# Altium footprint library DriverBoardForCNC.PcbLib: 26 footprints (part 1 of 2)
Each footprint in its own frame and in the unit in brackets; x right, y up, seen from the top. Pads: shape width x height; smd on the part's side, far side on the other; paste and mask are expansions set on the pad; w line width, h text height; cw(c..) or ccw(c..) is an arc to the next point about the centre after c.
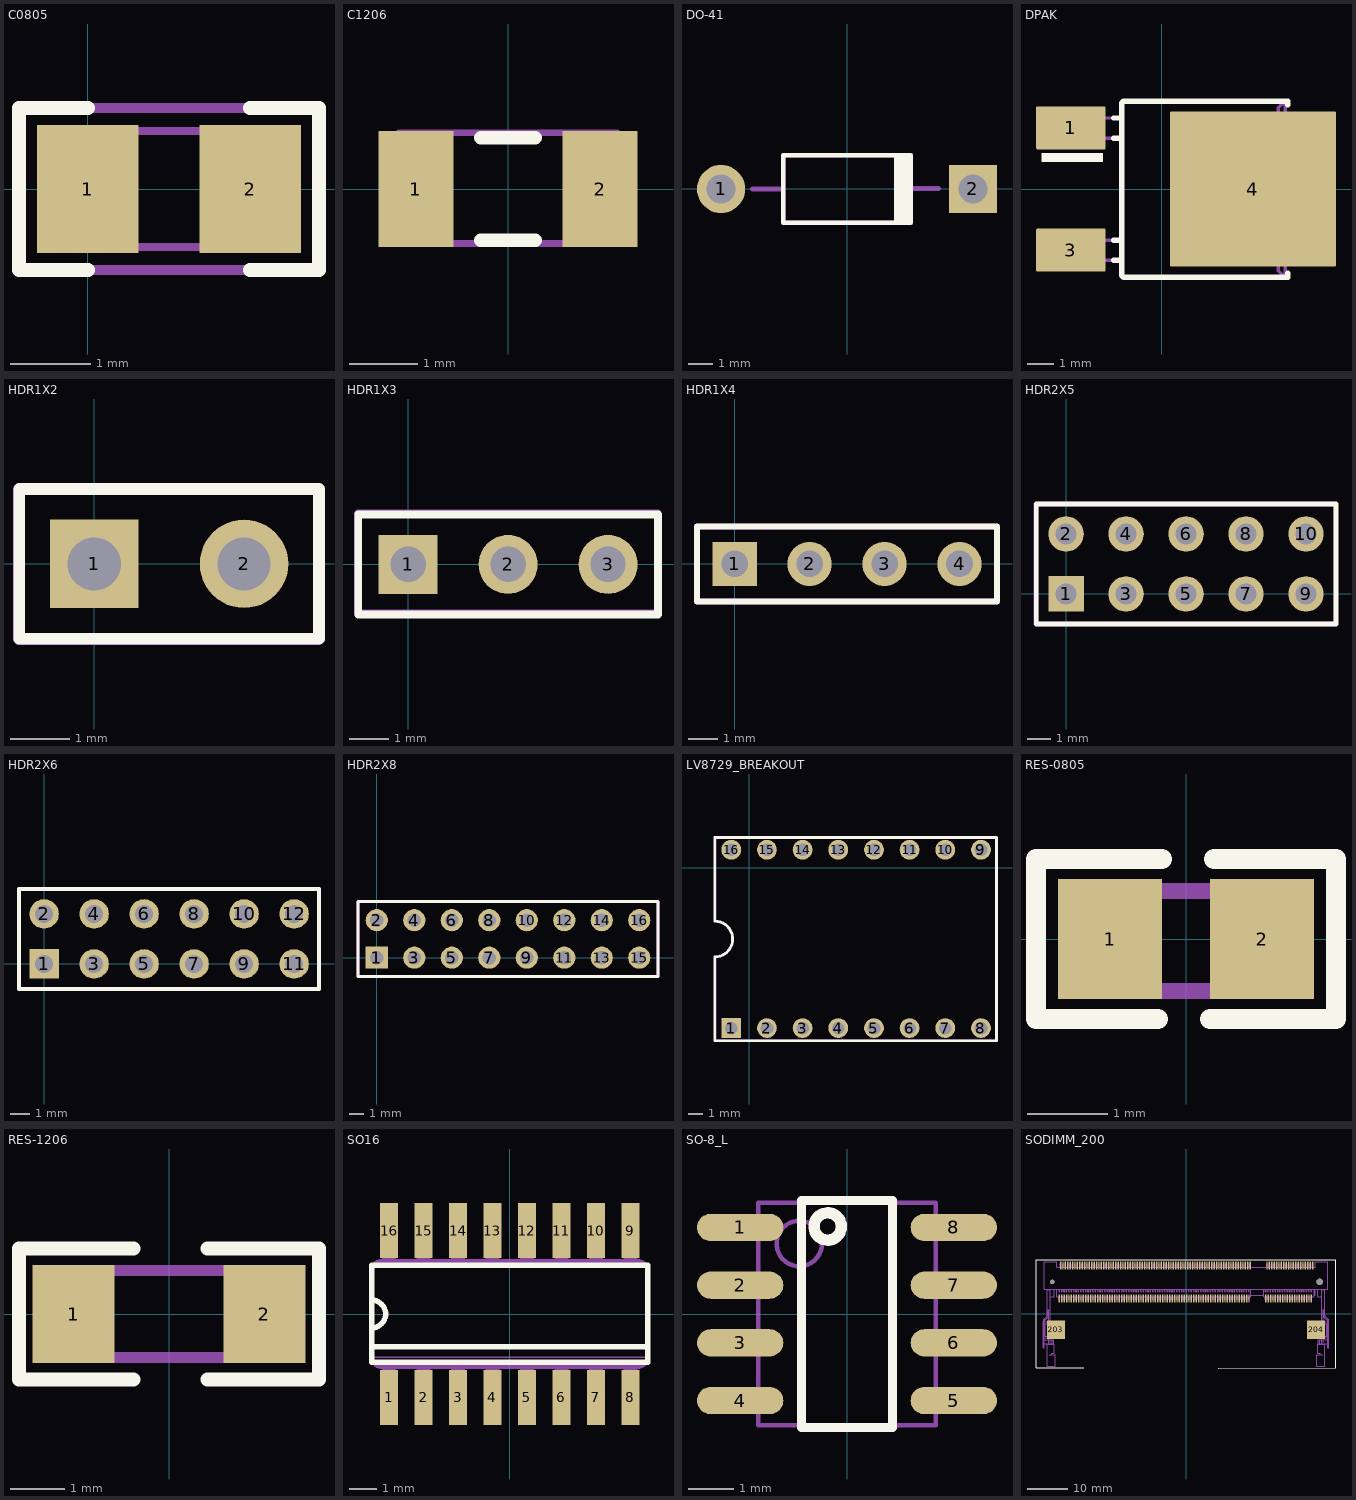
[diagram p0: the footprints below, top view; thin cyan lines are the x and y axes]

## C0805 [mil]
pads (2):
  rect 50x63 smd: 1(0,0) 2(80,0)
Top Overlay:
  lines w7: 0,-40 -34,-40 -34,0 -34,40 0,40 ; 80,-40 114,-40 114,0 114,40 80,40
M5-Top Constraints:
  lines w5: -34,-40 -34,40 114,40 114,-40 -34,-40
  text ".Designator" at -24,-17 h35
M13-Bottom 3D Body:
  lines w3.94: 14.41,-28.54 14.41,28.54 ; 65.59,-28.54 65.59,28.54 ; -3.31,-28.54 -3.31,28.54 83.31,28.54 83.31,-28.54 -3.31,-28.54
3D body "CAP 0805.x_t": height 50.66, standoff 0.5, extent -0.35,-24.57 78.39,25.59

## C1206 [mm] "Chip Capacitor, Body 3.2x1.6mm, IPC High Density"
height 1.3
pads (2):
  rect 1.1x1.7 smd: 1(-1.35,0) 2(1.35,0)
Top Overlay:
  lines w0.2: -0.4,-0.75 0.4,-0.75 ; -0.4,0.75 0.4,0.75
M14-Top Assembly:
  lines w0.1: -1.6,-0.8 1.6,-0.8 1.6,0.825 -1.6,0.825 -1.6,-0.8
3D body "CAP 1206.x_t": height 1.64, standoff 0.01, extent -1.6,-0.8 1.6,0.824

## DO-41 [mm] "Diode, Axial; Body 5.2 x 2.7 mm (LxDia. max), Lead Dia. 0.86 mm (max)"
height 2.8
pads (2):
  round 2 hole 1.2: 1(-5.23,0)
  rect 2x2 hole 1.2: 2(5.23,0)
Top Overlay:
  rectangle: 1.95,-1.4 2.75,1.4
  lines w0.2: 2.65,-1.4 -2.65,-1.4 -2.65,1.4 2.65,1.4
M14-Top Assembly:
  rectangle: 1.95,-1.4 2.75,1.4
  lines w0.2: -3.925,0 -2.65,0 ; 2.65,-1.4 -2.65,-1.4 -2.65,1.4 2.65,1.4 ; 2.675,0.025 3.8,0.025
3D body "DO-41-L=10.5.x_t": height 2.82, standoff -2.3, extent -5.654,-1.319 5.704,1.32

## DPAK [mm] "D-PAK, 3-Pads, Body 6.22x6.73mm (max), TO-252AA using nominal STEP model"
height 2.39
pads (3):
  rrect6% 2.6x1.6 smd: 1(-3.4,2.28) 3(-3.4,-2.28)
  rrect2% 6.2x5.8 smd paste-2.9: 4(3.4,0)
Top Overlay:
  rectangle: -4.5,1 -2.2,1.35
  lines w0.2: -1.8,1.9 -1.5,1.9 ; -1.8,2.65 -1.5,2.65 ; 4.7,-3.3 -1.429,-3.3 -1.5,-3.229 -1.5,-3.157 -1.5,-2.665 ; 4.7,-3.28 4.7,-3.15 ; 4.7,3.15 4.7,3.28 -1.429,3.28 -1.5,3.209 -1.5,3.137 -1.5,-1.915 ; -1.8,-2.665 -1.5,-2.665 ; -1.8,-2.665 -1.5,-2.665 ; -1.8,-2.665 -1.5,-2.665 ; -1.8,-1.915 -1.5,-1.915 ; -1.8,-1.915 -1.5,-1.915 ; -1.8,-1.915 -1.5,-1.915 ; -1.5,-2.665 -1.5,-1.915 ; -1.5,-2.665 -1.5,-1.915 ; -1.5,-2.665 -1.5,-1.915
Top Paste:
  rectangle: 0.4,1.625 1.675,2.8
  rectangle: 1.975,1.625 3.25,2.8
  rectangle: 3.55,1.625 4.825,2.8
  rectangle: 5.125,1.625 6.4,2.8
  rectangle: 0.4,0.15 1.675,1.325
  rectangle: 1.975,0.15 3.25,1.325
  rectangle: 3.55,0.15 4.825,1.325
  rectangle: 5.125,0.15 6.4,1.325
  rectangle: 0.4,-1.325 1.675,-0.15
  rectangle: 1.975,-1.325 3.25,-0.15
  rectangle: 3.55,-1.325 4.825,-0.15
  rectangle: 5.125,-1.325 6.4,-0.15
  rectangle: 5.125,-2.8 6.4,-1.625
  rectangle: 3.55,-2.8 4.825,-1.625
  rectangle: 1.975,-2.8 3.25,-1.625
  rectangle: 0.4,-2.8 1.675,-1.625
M5-Top Constraints:
  lines w0.127: -1.5,1.9 -2.757,1.9 -3.157,1.9 ; -1.5,2.65 -2.757,2.65 -3.157,2.65 ; -3.899,-2.665 -3.357,-2.665 ; -3.899,-2.665 -3.899,-1.915 ; -3.899,-2.665 -3.357,-2.665 ; -3.899,-2.665 -3.899,-1.915 ; -3.899,-2.665 -3.357,-2.665 ; -3.899,-2.665 -3.899,-1.915 ; -3.899,-1.915 -3.357,-1.915 ; -3.899,-1.915 -3.357,-1.915 ; -3.899,-1.915 -3.357,-1.915 ; -3.357,-2.665 -3.157,-2.665 ; -3.357,-2.665 -3.157,-2.665 ; -3.357,-2.665 -3.157,-2.665 ; -3.357,-1.915 -3.157,-1.915 ; -3.357,-1.915 -3.157,-1.915 ; -3.357,-1.915 -3.157,-1.915 ; -3.157,-2.665 -3.157,-1.915 ; -3.157,-2.665 -2.757,-2.665 ; -3.157,-2.665 -3.157,-1.915 ; -3.157,-2.665 -2.757,-2.665 ; -3.157,-2.665 -3.157,-1.915 ; -3.157,-2.665 -2.757,-2.665 ; -3.157,-1.915 -2.757,-1.915 ; -3.157,-1.915 -2.757,-1.915 ; -3.157,-1.915 -2.757,-1.915 ; -3.157,1.9 -3.357,1.9 -3.899,1.9 -3.899,2.65 -3.357,2.65 -3.157,2.65 ; -3.157,1.9 -3.157,2.65 ; -2.757,-2.665 -1.5,-2.665 ; -2.757,-2.665 -1.5,-2.665 ; -2.757,-2.665 -1.5,-2.665 ; -2.757,-1.915 -1.5,-1.915 ; -2.757,-1.915 -1.5,-1.915 ; -2.757,-1.915 -1.5,-1.915 ; -1.5,-2.665 -1.5,-1.915 ; -1.5,-2.665 -1.5,-1.915 ; -1.5,-2.665 -1.5,-1.915 ; -1.5,-2.665 -1.5,-3.157 -1.5,-3.229 -1.429,-3.3 4.6,-3.3 ; -1.5,-1.915 -1.5,3.137 -1.5,3.209 -1.429,3.28 4.6,3.28 ; 4.6,-3.3 4.6,-2.69 5.8,-2.69 5.8,-2.01 5.308,-2.01 5.308,1.99 5.8,1.99 5.8,2.67 4.6,2.67 4.6,3.28 ; 4.6,-3.3 4.348,-3.048 4.348,3.028 4.6,3.28
  text ".Designator" at -2.65,4.125 h1.02
3D body "td03b.stp": height 2.48, standoff 0.01, extent -3.856,-3.29 5.843,3.29

## HDR1X2 [mm] "Connector; Header; 2 Position"
pads (2):
  rect 1.5x1.5 hole 0.9: 1(0,0)
  round 1.5 hole 0.9: 2(2.54,0)
Top Overlay:
  lines w0.2: -1.27,-1.27 3.81,-1.27 3.81,1.27 -1.27,1.27 -1.27,-1.27
M14-Top Assembly:
  lines w0.2: -1.275,-1.275 -1.275,1.265 3.805,1.265 3.805,-1.275 -1.275,-1.275
3D body "PLS-2 (DS1021-1x2).x_b": height 8.61, standoff -2.99, extent -1.265,-1.275 3.815,1.265

## HDR1X3 [mm] "Connector; Header; 3 Position"
pads (3):
  rect 1.5x1.5 hole 0.9: 1(0,0)
  round 1.5 hole 0.9: 2(2.54,0) 3(5.08,0)
Top Overlay:
  lines w0.2: -1.27,-1.27 -1.27,1.27 6.35,1.27 6.35,-1.27 -1.27,-1.27
M14-Top Assembly:
  lines w0.2: -1.275,-1.25 6.345,-1.25 6.345,1.29 -1.275,1.29 -1.275,-1.25
3D body "PLS-3 (DS1021-1x3).x_b": height 8.61, standoff -2.99, extent -1.285,-1.275 6.335,1.265

## HDR1X4 [mm] "Connector; Header; 4 Position"
pads (4):
  rect 1.5x1.5 hole 0.9: 1(0,0)
  round 1.5 hole 0.9: 2(2.54,0) 3(5.08,0) 4(7.62,0)
Top Overlay:
  lines w0.2: -1.27,-1.27 -1.27,1.27 8.89,1.27 8.89,-1.27 -1.27,-1.27
M14-Top Assembly:
  lines w0.2: -1.275,-1.275 -1.275,1.265 8.885,1.265 8.885,-1.275 -1.275,-1.275
3D body "PLS-4 (DS1021-1x4).x_b": height 8.61, standoff -2.99, extent -1.28,-1.275 8.88,1.265

## HDR2X5 [mm] "Connector; Header; 5x2 Position"
pads (10):
  rect 1.5x1.5 hole 0.9: 1(0,0)
  round 1.5 hole 0.9: 2(0,2.54) 3(2.54,0) 4(2.54,2.54) 5(5.08,0) 6(5.08,2.54) 7(7.62,0) 8(7.62,2.54) 9(10.16,0) 10(10.16,2.54)
Top Overlay:
  lines w0.2: -1.27,-1.27 11.43,-1.27 11.43,3.81 -1.27,3.81 -1.27,-1.27
M14-Top Assembly:
  lines w0.2: -1.275,-1.275 -1.275,3.805 11.425,3.805 11.425,-1.275 -1.275,-1.275
  text "1" at -2.032,-0.508 h1.27
  text "2" at -2.54,2.032 h1.27
  text "10" at 11.684,2.032 h1.27
  text "9" at 11.684,-0.508 h1.27
3D body "PLS (DS1021-2x5).x_t": height 8.61, standoff -2.99, extent -1.275,-1.28 11.425,3.8

## HDR2X6 [mm] "Connector; Header; 6x2 Position"
pads (12):
  rect 1.5x1.5 hole 0.9: 1(0,0)
  round 1.5 hole 0.9: 2(0,2.54) 3(2.54,0) 4(2.54,2.54) 5(5.08,0) 6(5.08,2.54) 7(7.62,0) 8(7.62,2.54) 9(10.16,0) 10(10.16,2.54) 11(12.7,0) 12(12.7,2.54)
Top Overlay:
  lines w0.2: -1.27,-1.27 13.965,-1.27 13.965,3.81 -1.27,3.81 -1.27,-1.27
M14-Top Assembly:
  lines w0.2: -1.275,-1.275 -1.275,3.805 13.965,3.805 13.965,-1.275 -1.275,-1.275
  text "11" at 14.224,-0.508 h1.27
  text "12" at 14.224,2.032 h1.27
  text "1" at -2.032,-0.508 h1.27
  text "2" at -2.54,2.032 h1.27
3D body "PLS (DS1021-2x6).x_t": height 8.61, standoff -2.99, extent -1.27,-1.275 13.97,3.805

## HDR2X8 [mm] "Connector; Header; 8x2 Position"
pads (16):
  rect 1.5x1.5 hole 0.9: 1(0,0)
  round 1.5 hole 0.9: 2(0,2.54) 3(2.54,0) 4(2.54,2.54) 5(5.08,0) 6(5.08,2.54) 7(7.62,0) 8(7.62,2.54) 9(10.16,0) 10(10.16,2.54) 11(12.7,0) 12(12.7,2.54) 13(15.24,0) 14(15.24,2.54) 15(17.78,0) 16(17.78,2.54)
Top Overlay:
  lines w0.2: -1.27,-1.27 -1.27,3.81 19.05,3.81 19.05,-1.27 -1.27,-1.27
M14-Top Assembly:
  lines w0.2: -1.275,-1.28 19.045,-1.28 19.045,3.8 -1.275,3.8 -1.275,-1.28
  text "15" at 19.304,-0.508 h1.27
  text "16" at 19.304,2.032 h1.27
  text "2" at -2.54,2.032 h1.27
  text "1" at -2.275,-0.525 h1.27
3D body "PLS (DS1021-2x8).x_t": height 8.61, standoff -2.99, extent -1.285,-1.28 19.035,3.8

## LV8729_BREAKOUT [mm] "LV8729_BREAKOUT"
pads (16):
  rect 1.408x1.408 hole 0.9: 1(-1.27,-11.43)
  round 1.408 / inner round 0 / far side round 1.408 hole 0.9: 2(1.27,-11.43) 3(3.81,-11.43) 4(6.35,-11.43) 5(8.89,-11.43) 6(11.43,-11.43) 7(13.97,-11.43) 8(16.51,-11.43) 9(16.51,1.27) 10(13.97,1.27) 11(11.43,1.27) 12(8.89,1.27) 13(6.35,1.27) 14(3.81,1.27) 15(1.27,1.27) 16(-1.27,1.27)
Top Overlay:
  lines w0.2: -2.441,-12.328 -2.441,-6.359 ccw(c-2.441,-5.089) -2.441,-3.819 -2.441,2.15 17.625,2.15 17.625,-12.328 -2.441,-12.328
M14-Top Assembly:
  lines w0.152: -2.413,-12.319 17.653,-12.319 17.653,2.159 -2.413,2.159 -2.413,-3.81 cw(c-2.413,-5.08) -2.413,-6.35 -2.413,-12.319
  text "DIR" at 17.145,-10.16 h1.5
  text "GND" at 16.95,-2.625 h1.5
  text "STEP" at 14.605,-10.16 h1.5
  text "VDD" at 14.45,-2.575 h1.5
  text "MS2" at 4.445,-10.16 h1.5
  text "MS3" at 6.985,-10.16 h1.5
  text "2B" at 4.225,-1.35 h1.5
  text "2A" at 6.65,-1.325 h1.5
  text "SLP" at 12.065,-10.16 h1.5
  text "RST" at 9.525,-10.16 h1.5
  text "1A" at 9.175,-1.425 h1.5
  text "MS1" at 1.905,-10.16 h1.5
  text "GND" at 1.7,-2.675 h1.5
  text "Vmot" at -0.9,-3.025 h1.5
  text "1B" at 11.875,-1.45 h1.5
  text "EN" at -0.635,-10.16 h1.5
3D body "LV8729Driver.x_b": height 26.01, standoff -2.99, extent -2.55,-12.725 17.8,2.525

## RES-0805 [mm] "Chip Resistor; Body 2 x 1.3 mm (LxW typ)"
height 0.6
pads (2):
  rect 1.3x1.5 smd: 1(-0.95,0) 2(0.95,0)
Top Overlay:
  lines w0.254: -0.35,-1 -1.875,-1 -1.875,1 -0.3,1 ; 0.3,-1 1.875,-1 1.875,1 0.35,1
M14-Top Assembly:
  lines w0.2: -1.25,-0.65 -1.25,0.6 1.3,0.6 1.3,-0.65 -1.25,-0.65
3D body "Resistor 0805.x_b": height 0.51, standoff 0.01, extent -1.236,-0.65 1.286,0.6

## RES-1206 [mm] "Chip Resistor; Body  x mm (LxW typ)"
pads (2):
  rect 1.5x1.8 smd: 1(-1.75,0) 2(1.75,0)
Top Overlay:
  lines w0.254: -2.75,1.175 -2.75,-1.2 -0.65,-1.2 ; -2.75,1.2 -0.65,1.2 ; 0.7,-1.2 2.75,-1.2 2.75,1.175 ; 0.7,1.2 2.75,1.2
M14-Top Assembly:
  lines w0.2: -1.9,-0.8 1.9,-0.8 1.9,0.8 0.3,0.8 -1.9,0.8 -1.9,-0.8
3D body "Resistor 1206.x_t": height 0.61, standoff 0.01, extent -1.9,-0.8 1.9,0.8

## SO16 [mil] "SO16 D Small outline"
height 68.9
pads (16):
  rect 26x80 smd: 1(-175,-121) 2(-125,-121) 3(-75,-121) 4(-25,-121) 5(25,-121) 6(75,-121) 7(125,-121) 8(175,-121) 9(175,121) 10(125,121) 11(75,121) 12(25,121) 13(-25,121) 14(-75,121) 15(-125,121) 16(-175,121)
Top Overlay:
  lines w7.87: -200,-47.24 200,-47.24 ; -200,70.87 -200,20 ; -199.8,70.87 200,70.87 200,-70.11 -200,-70.11 -200,-20 ; -200,-20 ccw(c-200,0) -200,20 ; -200,-20 -200,20
M4-Bottom Dimensions:
  region: 165,77 165,122 185,122 185,77
  region: 115,77 115,122 135,122 135,77
  region: 65,77 65,122 85,122 85,77
  region: 15,77 15,122 35,122 35,77
  region: 165,-122 165,-77 185,-77 185,-122
  region: 115,-122 115,-77 135,-77 135,-122
  region: 65,-122 65,-77 85,-77 85,-122
  region: 15,-122 15,-77 35,-77 35,-122
  region: -185,77 -185,122 -165,122 -165,77
  region: -135,77 -135,122 -115,122 -115,77
  region: -85,77 -85,122 -65,122 -65,77
  region: -35,-122 -35,-77 -15,-77 -15,-122
  region: -85,-121 -85,-76 -65,-76 -65,-121
  region: -135,-122 -135,-77 -115,-77 -115,-122
  region: -185,-122 -185,-77 -165,-77 -165,-122
  region: -35,77 -35,122 -15,122 -15,77
M14-Top Assembly:
  lines w2: -200,-63 200,-63
  lines w6: -200,-20 ccw(c-200,0) -200,20 ; -200,-20 -200,-62 ccw(c-185,-62) -185,-77 185,-77 ccw(c185,-62) 200,-62 200,62 ccw(c185,62) 185,77 -185,77 ccw(c-185,62) -200,62 -200,20 ; -200,-20 -200,20
3D body "SOIC16 narrow.x_b": height 78.74, standoff 0.13, extent -198.43,-121.32 198.42,121.32

## SO-8_L [mm] "8-Pin Small Outline Integrated Circuit 1.27 mm Pitch, IPC High Density"
height 1.75
pads (8):
  oval 1.9x0.6 smd: 1(-2.35,1.905) 2(-2.35,0.635) 3(-2.35,-0.635) 4(-2.35,-1.905) 5(2.35,-1.905) 6(2.35,-0.635) 7(2.35,0.635) 8(2.35,1.905)
Top Overlay:
  circle w0.25: c-0.425,1.925 r0.3
  lines w0.2: -1,-2.5 1,-2.5 1,2.5 -1,2.5 -1,-2.5
M14-Top Assembly:
  circle w0.1: c-1.05,1.55 r0.5
  lines w0.1: -1.95,-2.45 1.95,-2.45 1.95,2.45 -1.95,2.45 -1.95,-2.45
3D body "SO-8.x_t": height 1.51, standoff 0.01, extent -3.089,-2.425 2.939,2.475

## SODIMM_200 [mm] "SMD"
height 5.2
pads (204):
  rect 0.35x2 smd paste-20: 1(31.65,12.1) 2(31.35,3.9) 3(31.05,12.1) 4(30.75,3.9) 5(30.45,12.1) 6(30.15,3.9) 7(29.85,12.1) 8(29.55,3.9) 9(29.25,12.1) 10(28.95,3.9) 11(28.65,12.1) 12(28.35,3.9) 13(28.05,12.1) 14(27.75,3.9) 15(27.45,12.1) 16(27.15,3.9) 17(26.85,12.1) 18(26.55,3.9) 19(26.25,12.1) 20(25.95,3.9) 21(25.65,12.1) 22(25.35,3.9) 23(25.05,12.1) 24(24.75,3.9) 25(24.45,12.1) 26(24.15,3.9) 27(23.85,12.1) 28(23.55,3.9) 29(23.25,12.1) 30(22.95,3.9) 31(22.65,12.1) 32(22.35,3.9) 33(22.05,12.1) 34(21.75,3.9) 35(21.45,12.1) 36(21.15,3.9) 37(20.85,12.1) 38(20.55,3.9) 39(20.25,12.1) 40(19.95,3.9) 41(16.05,12.1) 42(15.75,3.9) 43(15.45,12.1) 44(15.15,3.9) 45(14.85,12.1) 46(14.55,3.9) 47(14.25,12.1) 48(13.95,3.9) 49(13.65,12.1) 50(13.35,3.9) 51(13.05,12.1) 52(12.75,3.9) 53(12.45,12.1) 54(12.15,3.9) 55(11.85,12.1) 56(11.55,3.9) 57(11.25,12.1) 58(10.95,3.9) 59(10.65,12.1) 60(10.35,3.9) 61(10.05,12.1) 62(9.75,3.9) 63(9.45,12.1) 64(9.15,3.9) 65(8.85,12.1) 66(8.55,3.9) 67(8.25,12.1) 68(7.95,3.9) 69(7.65,12.1) 70(7.35,3.9) 71(7.05,12.1) 72(6.75,3.9) 73(6.45,12.1) 74(6.15,3.9) 75(5.85,12.1) 76(5.55,3.9) 77(5.25,12.1) 78(4.95,3.9) 79(4.65,12.1) 80(4.35,3.9) 81(4.05,12.1) 82(3.75,3.9) 83(3.45,12.1) 84(3.15,3.9) 85(2.85,12.1) 86(2.55,3.9) 87(2.25,12.1) 88(1.95,3.9) 89(1.65,12.1) 90(1.35,3.9) 91(1.05,12.1) 92(0.75,3.9) 93(0.45,12.1) 94(0.15,3.9) 95(-0.15,12.1) 96(-0.45,3.9) 97(-0.75,12.1) 98(-1.05,3.9) 99(-1.35,12.1) 100(-1.65,3.9) 101(-1.95,12.1) 102(-2.25,3.9) 103(-2.55,12.1) 104(-2.85,3.9) 105(-3.15,12.1) 106(-3.45,3.9) 107(-3.75,12.1) 108(-4.05,3.9) 109(-4.35,12.1) 110(-4.65,3.9) 111(-4.95,12.1) 112(-5.25,3.9) 113(-5.55,12.1) 114(-5.85,3.9) 115(-6.15,12.1) 116(-6.45,3.9) 117(-6.75,12.1) 118(-7.05,3.9) 119(-7.35,12.1) 120(-7.65,3.9) 121(-7.95,12.1) 122(-8.25,3.9) 123(-8.55,12.1) 124(-8.85,3.9) 125(-9.15,12.1) 126(-9.45,3.9) 127(-9.75,12.1) 128(-10.05,3.9) 129(-10.35,12.1) 130(-10.65,3.9) 131(-10.95,12.1) 132(-11.25,3.9) 133(-11.55,12.1) 134(-11.85,3.9) 135(-12.15,12.1) 136(-12.45,3.9) 137(-12.75,12.1) 138(-13.05,3.9) 139(-13.35,12.1) 140(-13.65,3.9) 141(-13.95,12.1) 142(-14.25,3.9) 143(-14.55,12.1) 144(-14.85,3.9) 145(-15.15,12.1) 146(-15.45,3.9) 147(-15.75,12.1) 148(-16.05,3.9) 149(-16.35,12.1) 150(-16.65,3.9) 151(-16.95,12.1) 152(-17.25,3.9) 153(-17.55,12.1) 154(-17.85,3.9) 155(-18.15,12.1) 156(-18.45,3.9) 157(-18.75,12.1) 158(-19.05,3.9) 159(-19.35,12.1) 160(-19.65,3.9) 161(-19.95,12.1) 162(-20.25,3.9) 163(-20.55,12.1) 164(-20.85,3.9) 165(-21.15,12.1) 166(-21.45,3.9) 167(-21.75,12.1) 168(-22.05,3.9) 169(-22.35,12.1) 170(-22.65,3.9) 171(-22.95,12.1) 172(-23.25,3.9) 173(-23.55,12.1) 174(-23.85,3.9) 175(-24.15,12.1) 176(-24.45,3.9) 177(-24.75,12.1) 178(-25.05,3.9) 179(-25.35,12.1) 180(-25.65,3.9) 181(-25.95,12.1) 182(-26.25,3.9) 183(-26.55,12.1) 184(-26.85,3.9) 185(-27.15,12.1) 186(-27.45,3.9) 187(-27.75,12.1) 188(-28.05,3.9) 189(-28.35,12.1) 190(-28.65,3.9) 191(-28.95,12.1) 192(-29.25,3.9) 193(-29.55,12.1) 194(-29.85,3.9) 195(-30.15,12.1) 196(-30.45,3.9) 197(-30.75,12.1) 198(-31.05,3.9) 199(-31.35,12.1) 200(-31.65,3.9)
  rect 4.5x4.6 smd paste-25.4: 203(-32.55,-4) 204(32.55,-4)
  round 1.6 hole 1.6 unplated: MH1(33.4,8)
  round 1.1 hole 1.1 unplated: MH2(-33.4,8)
Top Overlay:
  lines w0.2: -25.556,-13.52 -37.5,-13.52 -37.5,13.48 37.5,13.48 37.5,-13.52 8.124,-13.52
Top Paste:
  drawing of 218 lines, arcs and shapes, not listed
M15-Bottom Assembly:
  drawing of 2068 lines, arcs and shapes, not listed
  text ".Designator" at -2.2,7.5 h3.5
  text "2" at 30.826,1.028 h1.8
  text "1" at 30.967,13.187 h1.8
  text "200" at -32.885,0.948 h1.8
  text "199" at -32.377,13.187 h1.8
3D body "SODIMM_200.STEP": height 5.2, standoff -1.2, extent -35.75,-13.05 35.75,13